# Altium footprint library Connector_PinHeader_1.27mm.PcbLib: 278 footprints (part 15 of 18)
Each footprint in its own frame and in the unit in brackets; x right, y up, seen from the top. Pads: shape width x height; smd on the part's side, far side on the other; paste and mask are expansions set on the pad; w line width, h text height; cw(c..) or ccw(c..) is an arc to the next point about the centre after c.
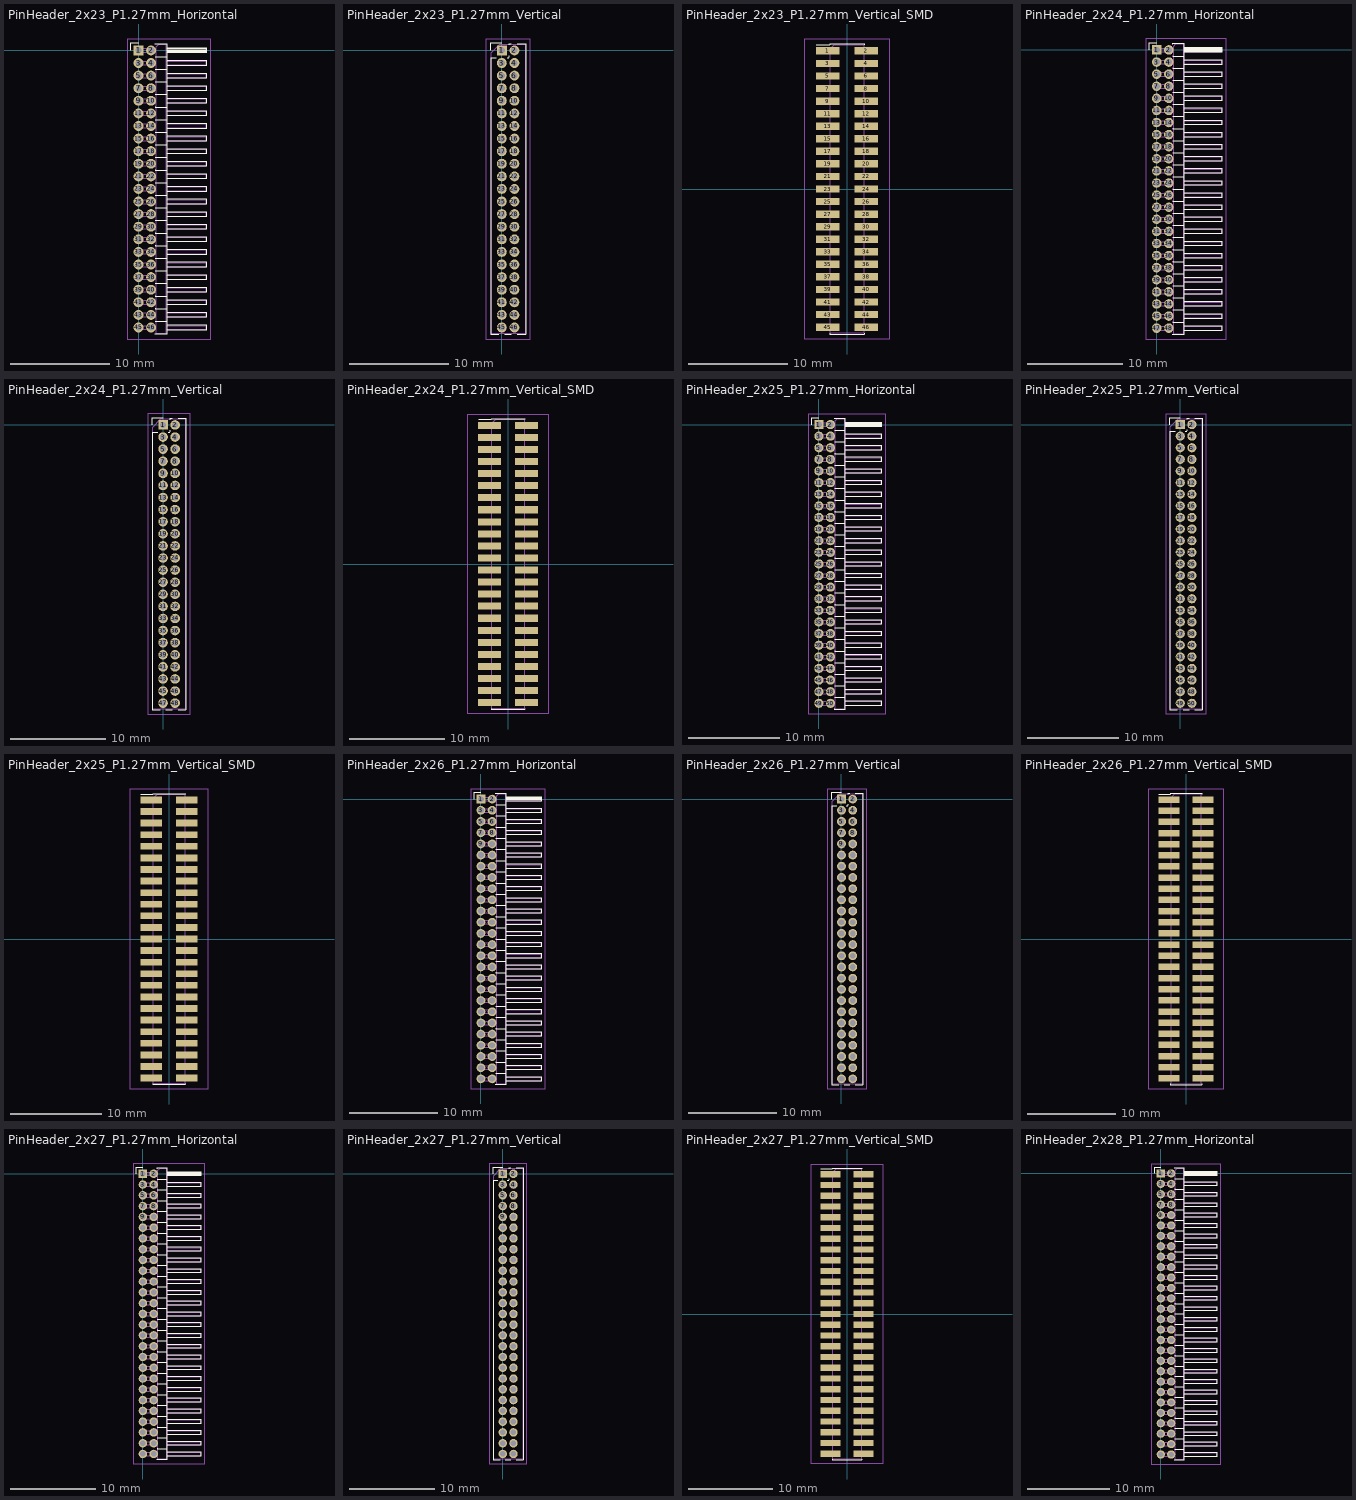
[diagram p14: the footprints below, top view; thin cyan lines are the x and y axes]

## PinHeader_2x23_P1.27mm_Horizontal [mm]
pads (46):
  rect 1x1 hole 0.65: 1(0,0)
  rrect100% 1x1 hole 0.65: 2(1.27,0) 3(0,-1.27) 4(1.27,-1.27) 5(0,-2.54) 6(1.27,-2.54) 7(0,-3.81) 8(1.27,-3.81) 9(0,-5.08) 10(1.27,-5.08) 11(0,-6.35) 12(1.27,-6.35) 13(0,-7.62) 14(1.27,-7.62) 15(0,-8.89) 16(1.27,-8.89) 17(0,-10.16) 18(1.27,-10.16) 19(0,-11.43) 20(1.27,-11.43) 21(0,-12.7) 22(1.27,-12.7) 23(0,-13.97) 24(1.27,-13.97) 25(0,-15.24) 26(1.27,-15.24) 27(0,-16.51) 28(1.27,-16.51) 29(0,-17.78) 30(1.27,-17.78) 31(0,-19.05) 32(1.27,-19.05) 33(0,-20.32) 34(1.27,-20.32) 35(0,-21.59) 36(1.27,-21.59) 37(0,-22.86) 38(1.27,-22.86) 39(0,-24.13) 40(1.27,-24.13) 41(0,-25.4) 42(1.27,-25.4) 43(0,-26.67) 44(1.27,-26.67) 45(0,-27.94) 46(1.27,-27.94)
F.SilkS:
  lines w0.12: -0.76,0 -0.76,0.76 0,0.76 ; 1.71,-28.56 1.71,-28.635 2.83,-28.635 2.83,0.695 1.71,0.695 1.71,0.62 ; 1.71,-27.32 1.71,-27.29 ; 1.71,-27.305 2.83,-27.305 ; 1.71,-26.05 1.71,-26.02 ; 1.71,-26.035 2.83,-26.035 ; 1.71,-24.78 1.71,-24.75 ; 1.71,-24.765 2.83,-24.765 ; 1.71,-23.51 1.71,-23.48 ; 1.71,-23.495 2.83,-23.495 ; 1.71,-22.24 1.71,-22.21 ; 1.71,-22.225 2.83,-22.225 ; 1.71,-20.97 1.71,-20.94 ; 1.71,-20.955 2.83,-20.955 ; 1.71,-19.7 1.71,-19.67 ; 1.71,-19.685 2.83,-19.685 ; 1.71,-18.43 1.71,-18.4 ; 1.71,-18.415 2.83,-18.415 ; 1.71,-17.16 1.71,-17.13 ; 1.71,-17.145 2.83,-17.145 ; 1.71,-15.89 1.71,-15.86 ; 1.71,-15.875 2.83,-15.875 ; 1.71,-14.62 1.71,-14.59 ; 1.71,-14.605 2.83,-14.605 ; 1.71,-13.35 1.71,-13.32 ; 1.71,-13.335 2.83,-13.335 ; 1.71,-12.08 1.71,-12.05 ; 1.71,-12.065 2.83,-12.065 ; 1.71,-10.81 1.71,-10.78 ; 1.71,-10.795 2.83,-10.795 ; 1.71,-9.54 1.71,-9.51 ; 1.71,-9.525 2.83,-9.525 ; 1.71,-8.27 1.71,-8.24 ; 1.71,-8.255 2.83,-8.255 ; 1.71,-7 1.71,-6.97 ; 1.71,-6.985 2.83,-6.985 ; 1.71,-5.73 1.71,-5.7 ; 1.71,-5.715 2.83,-5.715 ; 1.71,-4.46 1.71,-4.43 ; 1.71,-4.445 2.83,-4.445 ; 1.71,-3.19 1.71,-3.16 ; 1.71,-3.175 2.83,-3.175 ; 1.71,-1.92 1.71,-1.89 ; 1.71,-1.905 2.83,-1.905 ; 1.71,-0.65 1.71,-0.62 ; 1.71,-0.635 2.83,-0.635 ; 2.83,-28.2 6.83,-28.2 6.83,-27.68 2.83,-27.68 ; 2.83,-26.93 6.83,-26.93 6.83,-26.41 2.83,-26.41 ; 2.83,-25.66 6.83,-25.66 6.83,-25.14 2.83,-25.14 ; 2.83,-24.39 6.83,-24.39 6.83,-23.87 2.83,-23.87 ; 2.83,-23.12 6.83,-23.12 6.83,-22.6 2.83,-22.6 ; 2.83,-21.85 6.83,-21.85 6.83,-21.33 2.83,-21.33 ; 2.83,-20.58 6.83,-20.58 6.83,-20.06 2.83,-20.06 ; 2.83,-19.31 6.83,-19.31 6.83,-18.79 2.83,-18.79 ; 2.83,-18.04 6.83,-18.04 6.83,-17.52 2.83,-17.52 ; 2.83,-16.77 6.83,-16.77 6.83,-16.25 2.83,-16.25 ; 2.83,-15.5 6.83,-15.5 6.83,-14.98 2.83,-14.98 ; 2.83,-14.23 6.83,-14.23 6.83,-13.71 2.83,-13.71 ; 2.83,-12.96 6.83,-12.96 6.83,-12.44 2.83,-12.44 ; 2.83,-11.69 6.83,-11.69 6.83,-11.17 2.83,-11.17 ; 2.83,-10.42 6.83,-10.42 6.83,-9.9 2.83,-9.9 ; 2.83,-9.15 6.83,-9.15 6.83,-8.63 2.83,-8.63 ; 2.83,-7.88 6.83,-7.88 6.83,-7.36 2.83,-7.36 ; 2.83,-6.61 6.83,-6.61 6.83,-6.09 2.83,-6.09 ; 2.83,-5.34 6.83,-5.34 6.83,-4.82 2.83,-4.82 ; 2.83,-4.07 6.83,-4.07 6.83,-3.55 2.83,-3.55 ; 2.83,-2.8 6.83,-2.8 6.83,-2.28 2.83,-2.28 ; 2.83,-1.53 6.83,-1.53 6.83,-1.01 2.83,-1.01 ; 2.83,-0.26 6.83,-0.26 6.83,0.26 2.83,0.26 ; 2.83,-0.16 6.83,-0.16 ; 2.83,-0.04 6.83,-0.04 ; 2.83,0.08 6.83,0.08 ; 2.83,0.2 6.83,0.2
F.CrtYd:
  lines w0.05: -1.15,-29.1 7.3,-29.1 7.3,1.15 -1.15,1.15 -1.15,-29.1
F.Fab:
  lines w0.1: 1.77,-28.14 -0.2,-28.14 -0.2,-27.74 1.77,-27.74 ; 1.77,-26.87 -0.2,-26.87 -0.2,-26.47 1.77,-26.47 ; 1.77,-25.6 -0.2,-25.6 -0.2,-25.2 1.77,-25.2 ; 1.77,-24.33 -0.2,-24.33 -0.2,-23.93 1.77,-23.93 ; 1.77,-23.06 -0.2,-23.06 -0.2,-22.66 1.77,-22.66 ; 1.77,-21.79 -0.2,-21.79 -0.2,-21.39 1.77,-21.39 ; 1.77,-20.52 -0.2,-20.52 -0.2,-20.12 1.77,-20.12 ; 1.77,-19.25 -0.2,-19.25 -0.2,-18.85 1.77,-18.85 ; 1.77,-17.98 -0.2,-17.98 -0.2,-17.58 1.77,-17.58 ; 1.77,-16.71 -0.2,-16.71 -0.2,-16.31 1.77,-16.31 ; 1.77,-15.44 -0.2,-15.44 -0.2,-15.04 1.77,-15.04 ; 1.77,-14.17 -0.2,-14.17 -0.2,-13.77 1.77,-13.77 ; 1.77,-12.9 -0.2,-12.9 -0.2,-12.5 1.77,-12.5 ; 1.77,-11.63 -0.2,-11.63 -0.2,-11.23 1.77,-11.23 ; 1.77,-10.36 -0.2,-10.36 -0.2,-9.96 1.77,-9.96 ; 1.77,-9.09 -0.2,-9.09 -0.2,-8.69 1.77,-8.69 ; 1.77,-7.82 -0.2,-7.82 -0.2,-7.42 1.77,-7.42 ; 1.77,-6.55 -0.2,-6.55 -0.2,-6.15 1.77,-6.15 ; 1.77,-5.28 -0.2,-5.28 -0.2,-4.88 1.77,-4.88 ; 1.77,-4.01 -0.2,-4.01 -0.2,-3.61 1.77,-3.61 ; 1.77,-2.74 -0.2,-2.74 -0.2,-2.34 1.77,-2.34 ; 1.77,-1.47 -0.2,-1.47 -0.2,-1.07 1.77,-1.07 ; 1.77,-0.2 -0.2,-0.2 -0.2,0.2 1.77,0.2 ; 2.77,-28.14 6.77,-28.14 6.77,-27.74 2.77,-27.74 ; 2.77,-26.87 6.77,-26.87 6.77,-26.47 2.77,-26.47 ; 2.77,-25.6 6.77,-25.6 6.77,-25.2 2.77,-25.2 ; 2.77,-24.33 6.77,-24.33 6.77,-23.93 2.77,-23.93 ; 2.77,-23.06 6.77,-23.06 6.77,-22.66 2.77,-22.66 ; 2.77,-21.79 6.77,-21.79 6.77,-21.39 2.77,-21.39 ; 2.77,-20.52 6.77,-20.52 6.77,-20.12 2.77,-20.12 ; 2.77,-19.25 6.77,-19.25 6.77,-18.85 2.77,-18.85 ; 2.77,-17.98 6.77,-17.98 6.77,-17.58 2.77,-17.58 ; 2.77,-16.71 6.77,-16.71 6.77,-16.31 2.77,-16.31 ; 2.77,-15.44 6.77,-15.44 6.77,-15.04 2.77,-15.04 ; 2.77,-14.17 6.77,-14.17 6.77,-13.77 2.77,-13.77 ; 2.77,-12.9 6.77,-12.9 6.77,-12.5 2.77,-12.5 ; 2.77,-11.63 6.77,-11.63 6.77,-11.23 2.77,-11.23 ; 2.77,-10.36 6.77,-10.36 6.77,-9.96 2.77,-9.96 ; 2.77,-9.09 6.77,-9.09 6.77,-8.69 2.77,-8.69 ; 2.77,-7.82 6.77,-7.82 6.77,-7.42 2.77,-7.42 ; 2.77,-6.55 6.77,-6.55 6.77,-6.15 2.77,-6.15 ; 2.77,-5.28 6.77,-5.28 6.77,-4.88 2.77,-4.88 ; 2.77,-4.01 6.77,-4.01 6.77,-3.61 2.77,-3.61 ; 2.77,-2.74 6.77,-2.74 6.77,-2.34 2.77,-2.34 ; 2.77,-1.47 6.77,-1.47 6.77,-1.07 2.77,-1.07 ; 2.77,-0.2 6.77,-0.2 6.77,0.2 2.77,0.2 ; 1.77,-28.575 2.77,-28.575 2.77,0.635 2.02,0.635 1.77,0.385 1.77,-28.575
  text "'.Designator'" at 2.774,-16.398 h0.6

## PinHeader_2x23_P1.27mm_Vertical [mm]
pads (46):
  rect 1x1 hole 0.65: 1(0,0)
  rrect100% 1x1 hole 0.65: 2(1.27,0) 3(0,-1.27) 4(1.27,-1.27) 5(0,-2.54) 6(1.27,-2.54) 7(0,-3.81) 8(1.27,-3.81) 9(0,-5.08) 10(1.27,-5.08) 11(0,-6.35) 12(1.27,-6.35) 13(0,-7.62) 14(1.27,-7.62) 15(0,-8.89) 16(1.27,-8.89) 17(0,-10.16) 18(1.27,-10.16) 19(0,-11.43) 20(1.27,-11.43) 21(0,-12.7) 22(1.27,-12.7) 23(0,-13.97) 24(1.27,-13.97) 25(0,-15.24) 26(1.27,-15.24) 27(0,-16.51) 28(1.27,-16.51) 29(0,-17.78) 30(1.27,-17.78) 31(0,-19.05) 32(1.27,-19.05) 33(0,-20.32) 34(1.27,-20.32) 35(0,-21.59) 36(1.27,-21.59) 37(0,-22.86) 38(1.27,-22.86) 39(0,-24.13) 40(1.27,-24.13) 41(0,-25.4) 42(1.27,-25.4) 43(0,-26.67) 44(1.27,-26.67) 45(0,-27.94) 46(1.27,-27.94)
F.SilkS:
  lines w0.12: -1.13,0 -1.13,0.76 0,0.76 ; -0.563,-0.76 -1.13,-0.76 -1.13,-28.635 -0.308,-28.635 ; 0.308,-28.635 0.962,-28.635 ; 0.563,-0.76 0.707,-0.76 ; 0.76,-0.707 0.76,-0.563 ; 0.76,0.563 0.76,0.695 0.962,0.695 ; 1.578,-28.635 2.4,-28.635 2.4,0.695 1.578,0.695
F.CrtYd:
  lines w0.05: -1.6,-29.1 2.85,-29.1 2.85,1.15 -1.6,1.15 -1.6,-29.1
F.Fab:
  lines w0.1: -1.07,-28.575 -1.07,-0.218 -0.218,0.635 2.34,0.635 2.34,-28.575 -1.07,-28.575
  text "'.Designator'" at 1.475,-18.017 h1

## PinHeader_2x23_P1.27mm_Vertical_SMD [mm]
pads (46):
  rect 2.4x0.74 smd: 1(-1.95,13.97) 2(1.95,13.97) 3(-1.95,12.7) 4(1.95,12.7) 5(-1.95,11.43) 6(1.95,11.43) 7(-1.95,10.16) 8(1.95,10.16) 9(-1.95,8.89) 10(1.95,8.89) 11(-1.95,7.62) 12(1.95,7.62) 13(-1.95,6.35) 14(1.95,6.35) 15(-1.95,5.08) 16(1.95,5.08) 17(-1.95,3.81) 18(1.95,3.81) 19(-1.95,2.54) 20(1.95,2.54) 21(-1.95,1.27) 22(1.95,1.27) 23(-1.95,0) 24(1.95,0) 25(-1.95,-1.27) 26(1.95,-1.27) 27(-1.95,-2.54) 28(1.95,-2.54) 29(-1.95,-3.81) 30(1.95,-3.81) 31(-1.95,-5.08) 32(1.95,-5.08) 33(-1.95,-6.35) 34(1.95,-6.35) 35(-1.95,-7.62) 36(1.95,-7.62) 37(-1.95,-8.89) 38(1.95,-8.89) 39(-1.95,-10.16) 40(1.95,-10.16) 41(-1.95,-11.43) 42(1.95,-11.43) 43(-1.95,-12.7) 44(1.95,-12.7) 45(-1.95,-13.97) 46(1.95,-13.97)
F.SilkS:
  lines w0.12: -3.09,14.6 -1.765,14.6 -1.765,14.665 1.765,14.665 1.765,14.6 ; -1.765,-14.6 -1.765,-14.665 1.765,-14.665 1.765,-14.6
F.CrtYd:
  lines w0.05: -4.3,-15.15 4.3,-15.15 4.3,15.15 -4.3,15.15 -4.3,-15.15
F.Fab:
  lines w0.1: -1.705,-14.17 -2.75,-14.17 -2.75,-13.77 -1.705,-13.77 ; -1.705,-12.9 -2.75,-12.9 -2.75,-12.5 -1.705,-12.5 ; -1.705,-11.63 -2.75,-11.63 -2.75,-11.23 -1.705,-11.23 ; -1.705,-10.36 -2.75,-10.36 -2.75,-9.96 -1.705,-9.96 ; -1.705,-9.09 -2.75,-9.09 -2.75,-8.69 -1.705,-8.69 ; -1.705,-7.82 -2.75,-7.82 -2.75,-7.42 -1.705,-7.42 ; -1.705,-6.55 -2.75,-6.55 -2.75,-6.15 -1.705,-6.15 ; -1.705,-5.28 -2.75,-5.28 -2.75,-4.88 -1.705,-4.88 ; -1.705,-4.01 -2.75,-4.01 -2.75,-3.61 -1.705,-3.61 ; -1.705,-2.74 -2.75,-2.74 -2.75,-2.34 -1.705,-2.34 ; -1.705,-1.47 -2.75,-1.47 -2.75,-1.07 -1.705,-1.07 ; -1.705,-0.2 -2.75,-0.2 -2.75,0.2 -1.705,0.2 ; -1.705,1.07 -2.75,1.07 -2.75,1.47 -1.705,1.47 ; -1.705,2.34 -2.75,2.34 -2.75,2.74 -1.705,2.74 ; -1.705,3.61 -2.75,3.61 -2.75,4.01 -1.705,4.01 ; -1.705,4.88 -2.75,4.88 -2.75,5.28 -1.705,5.28 ; -1.705,6.15 -2.75,6.15 -2.75,6.55 -1.705,6.55 ; -1.705,7.42 -2.75,7.42 -2.75,7.82 -1.705,7.82 ; -1.705,8.69 -2.75,8.69 -2.75,9.09 -1.705,9.09 ; -1.705,9.96 -2.75,9.96 -2.75,10.36 -1.705,10.36 ; -1.705,11.23 -2.75,11.23 -2.75,11.63 -1.705,11.63 ; -1.705,12.5 -2.75,12.5 -2.75,12.9 -1.705,12.9 ; -1.705,13.77 -2.75,13.77 -2.75,14.17 -1.705,14.17 ; 1.705,-14.17 2.75,-14.17 2.75,-13.77 1.705,-13.77 ; 1.705,-12.9 2.75,-12.9 2.75,-12.5 1.705,-12.5 ; 1.705,-11.63 2.75,-11.63 2.75,-11.23 1.705,-11.23 ; 1.705,-10.36 2.75,-10.36 2.75,-9.96 1.705,-9.96 ; 1.705,-9.09 2.75,-9.09 2.75,-8.69 1.705,-8.69 ; 1.705,-7.82 2.75,-7.82 2.75,-7.42 1.705,-7.42 ; 1.705,-6.55 2.75,-6.55 2.75,-6.15 1.705,-6.15 ; 1.705,-5.28 2.75,-5.28 2.75,-4.88 1.705,-4.88 ; 1.705,-4.01 2.75,-4.01 2.75,-3.61 1.705,-3.61 ; 1.705,-2.74 2.75,-2.74 2.75,-2.34 1.705,-2.34 ; 1.705,-1.47 2.75,-1.47 2.75,-1.07 1.705,-1.07 ; 1.705,-0.2 2.75,-0.2 2.75,0.2 1.705,0.2 ; 1.705,1.07 2.75,1.07 2.75,1.47 1.705,1.47 ; 1.705,2.34 2.75,2.34 2.75,2.74 1.705,2.74 ; 1.705,3.61 2.75,3.61 2.75,4.01 1.705,4.01 ; 1.705,4.88 2.75,4.88 2.75,5.28 1.705,5.28 ; 1.705,6.15 2.75,6.15 2.75,6.55 1.705,6.55 ; 1.705,7.42 2.75,7.42 2.75,7.82 1.705,7.82 ; 1.705,8.69 2.75,8.69 2.75,9.09 1.705,9.09 ; 1.705,9.96 2.75,9.96 2.75,10.36 1.705,10.36 ; 1.705,11.23 2.75,11.23 2.75,11.63 1.705,11.63 ; 1.705,12.5 2.75,12.5 2.75,12.9 1.705,12.9 ; 1.705,13.77 2.75,13.77 2.75,14.17 1.705,14.17 ; -1.705,14.17 -1.705,-14.605 1.705,-14.605 1.705,14.605 -1.27,14.605 -1.705,14.17
  text "'.Designator'" at 0.84,-4.047 h1

## PinHeader_2x24_P1.27mm_Horizontal [mm]
pads (48):
  rect 1x1 hole 0.65: 1(0,0)
  rrect100% 1x1 hole 0.65: 2(1.27,0) 3(0,-1.27) 4(1.27,-1.27) 5(0,-2.54) 6(1.27,-2.54) 7(0,-3.81) 8(1.27,-3.81) 9(0,-5.08) 10(1.27,-5.08) 11(0,-6.35) 12(1.27,-6.35) 13(0,-7.62) 14(1.27,-7.62) 15(0,-8.89) 16(1.27,-8.89) 17(0,-10.16) 18(1.27,-10.16) 19(0,-11.43) 20(1.27,-11.43) 21(0,-12.7) 22(1.27,-12.7) 23(0,-13.97) 24(1.27,-13.97) 25(0,-15.24) 26(1.27,-15.24) 27(0,-16.51) 28(1.27,-16.51) 29(0,-17.78) 30(1.27,-17.78) 31(0,-19.05) 32(1.27,-19.05) 33(0,-20.32) 34(1.27,-20.32) 35(0,-21.59) 36(1.27,-21.59) 37(0,-22.86) 38(1.27,-22.86) 39(0,-24.13) 40(1.27,-24.13) 41(0,-25.4) 42(1.27,-25.4) 43(0,-26.67) 44(1.27,-26.67) 45(0,-27.94) 46(1.27,-27.94) 47(0,-29.21) 48(1.27,-29.21)
F.SilkS:
  lines w0.12: -0.76,0 -0.76,0.76 0,0.76 ; 1.71,-29.83 1.71,-29.905 2.83,-29.905 2.83,0.695 1.71,0.695 1.71,0.62 ; 1.71,-28.59 1.71,-28.56 ; 1.71,-28.575 2.83,-28.575 ; 1.71,-27.32 1.71,-27.29 ; 1.71,-27.305 2.83,-27.305 ; 1.71,-26.05 1.71,-26.02 ; 1.71,-26.035 2.83,-26.035 ; 1.71,-24.78 1.71,-24.75 ; 1.71,-24.765 2.83,-24.765 ; 1.71,-23.51 1.71,-23.48 ; 1.71,-23.495 2.83,-23.495 ; 1.71,-22.24 1.71,-22.21 ; 1.71,-22.225 2.83,-22.225 ; 1.71,-20.97 1.71,-20.94 ; 1.71,-20.955 2.83,-20.955 ; 1.71,-19.7 1.71,-19.67 ; 1.71,-19.685 2.83,-19.685 ; 1.71,-18.43 1.71,-18.4 ; 1.71,-18.415 2.83,-18.415 ; 1.71,-17.16 1.71,-17.13 ; 1.71,-17.145 2.83,-17.145 ; 1.71,-15.89 1.71,-15.86 ; 1.71,-15.875 2.83,-15.875 ; 1.71,-14.62 1.71,-14.59 ; 1.71,-14.605 2.83,-14.605 ; 1.71,-13.35 1.71,-13.32 ; 1.71,-13.335 2.83,-13.335 ; 1.71,-12.08 1.71,-12.05 ; 1.71,-12.065 2.83,-12.065 ; 1.71,-10.81 1.71,-10.78 ; 1.71,-10.795 2.83,-10.795 ; 1.71,-9.54 1.71,-9.51 ; 1.71,-9.525 2.83,-9.525 ; 1.71,-8.27 1.71,-8.24 ; 1.71,-8.255 2.83,-8.255 ; 1.71,-7 1.71,-6.97 ; 1.71,-6.985 2.83,-6.985 ; 1.71,-5.73 1.71,-5.7 ; 1.71,-5.715 2.83,-5.715 ; 1.71,-4.46 1.71,-4.43 ; 1.71,-4.445 2.83,-4.445 ; 1.71,-3.19 1.71,-3.16 ; 1.71,-3.175 2.83,-3.175 ; 1.71,-1.92 1.71,-1.89 ; 1.71,-1.905 2.83,-1.905 ; 1.71,-0.65 1.71,-0.62 ; 1.71,-0.635 2.83,-0.635 ; 2.83,-29.47 6.83,-29.47 6.83,-28.95 2.83,-28.95 ; 2.83,-28.2 6.83,-28.2 6.83,-27.68 2.83,-27.68 ; 2.83,-26.93 6.83,-26.93 6.83,-26.41 2.83,-26.41 ; 2.83,-25.66 6.83,-25.66 6.83,-25.14 2.83,-25.14 ; 2.83,-24.39 6.83,-24.39 6.83,-23.87 2.83,-23.87 ; 2.83,-23.12 6.83,-23.12 6.83,-22.6 2.83,-22.6 ; 2.83,-21.85 6.83,-21.85 6.83,-21.33 2.83,-21.33 ; 2.83,-20.58 6.83,-20.58 6.83,-20.06 2.83,-20.06 ; 2.83,-19.31 6.83,-19.31 6.83,-18.79 2.83,-18.79 ; 2.83,-18.04 6.83,-18.04 6.83,-17.52 2.83,-17.52 ; 2.83,-16.77 6.83,-16.77 6.83,-16.25 2.83,-16.25 ; 2.83,-15.5 6.83,-15.5 6.83,-14.98 2.83,-14.98 ; 2.83,-14.23 6.83,-14.23 6.83,-13.71 2.83,-13.71 ; 2.83,-12.96 6.83,-12.96 6.83,-12.44 2.83,-12.44 ; 2.83,-11.69 6.83,-11.69 6.83,-11.17 2.83,-11.17 ; 2.83,-10.42 6.83,-10.42 6.83,-9.9 2.83,-9.9 ; 2.83,-9.15 6.83,-9.15 6.83,-8.63 2.83,-8.63 ; 2.83,-7.88 6.83,-7.88 6.83,-7.36 2.83,-7.36 ; 2.83,-6.61 6.83,-6.61 6.83,-6.09 2.83,-6.09 ; 2.83,-5.34 6.83,-5.34 6.83,-4.82 2.83,-4.82 ; 2.83,-4.07 6.83,-4.07 6.83,-3.55 2.83,-3.55 ; 2.83,-2.8 6.83,-2.8 6.83,-2.28 2.83,-2.28 ; 2.83,-1.53 6.83,-1.53 6.83,-1.01 2.83,-1.01 ; 2.83,-0.26 6.83,-0.26 6.83,0.26 2.83,0.26 ; 2.83,-0.16 6.83,-0.16 ; 2.83,-0.04 6.83,-0.04 ; 2.83,0.08 6.83,0.08 ; 2.83,0.2 6.83,0.2
F.CrtYd:
  lines w0.05: -1.15,-30.35 -1.15,1.15 7.3,1.15 7.3,-30.35 -1.15,-30.35
F.Fab:
  lines w0.1: 1.77,-29.41 -0.2,-29.41 -0.2,-29.01 1.77,-29.01 ; 1.77,-28.14 -0.2,-28.14 -0.2,-27.74 1.77,-27.74 ; 1.77,-26.87 -0.2,-26.87 -0.2,-26.47 1.77,-26.47 ; 1.77,-25.6 -0.2,-25.6 -0.2,-25.2 1.77,-25.2 ; 1.77,-24.33 -0.2,-24.33 -0.2,-23.93 1.77,-23.93 ; 1.77,-23.06 -0.2,-23.06 -0.2,-22.66 1.77,-22.66 ; 1.77,-21.79 -0.2,-21.79 -0.2,-21.39 1.77,-21.39 ; 1.77,-20.52 -0.2,-20.52 -0.2,-20.12 1.77,-20.12 ; 1.77,-19.25 -0.2,-19.25 -0.2,-18.85 1.77,-18.85 ; 1.77,-17.98 -0.2,-17.98 -0.2,-17.58 1.77,-17.58 ; 1.77,-16.71 -0.2,-16.71 -0.2,-16.31 1.77,-16.31 ; 1.77,-15.44 -0.2,-15.44 -0.2,-15.04 1.77,-15.04 ; 1.77,-14.17 -0.2,-14.17 -0.2,-13.77 1.77,-13.77 ; 1.77,-12.9 -0.2,-12.9 -0.2,-12.5 1.77,-12.5 ; 1.77,-11.63 -0.2,-11.63 -0.2,-11.23 1.77,-11.23 ; 1.77,-10.36 -0.2,-10.36 -0.2,-9.96 1.77,-9.96 ; 1.77,-9.09 -0.2,-9.09 -0.2,-8.69 1.77,-8.69 ; 1.77,-7.82 -0.2,-7.82 -0.2,-7.42 1.77,-7.42 ; 1.77,-6.55 -0.2,-6.55 -0.2,-6.15 1.77,-6.15 ; 1.77,-5.28 -0.2,-5.28 -0.2,-4.88 1.77,-4.88 ; 1.77,-4.01 -0.2,-4.01 -0.2,-3.61 1.77,-3.61 ; 1.77,-2.74 -0.2,-2.74 -0.2,-2.34 1.77,-2.34 ; 1.77,-1.47 -0.2,-1.47 -0.2,-1.07 1.77,-1.07 ; 1.77,-0.2 -0.2,-0.2 -0.2,0.2 1.77,0.2 ; 2.77,-29.41 6.77,-29.41 6.77,-29.01 2.77,-29.01 ; 2.77,-28.14 6.77,-28.14 6.77,-27.74 2.77,-27.74 ; 2.77,-26.87 6.77,-26.87 6.77,-26.47 2.77,-26.47 ; 2.77,-25.6 6.77,-25.6 6.77,-25.2 2.77,-25.2 ; 2.77,-24.33 6.77,-24.33 6.77,-23.93 2.77,-23.93 ; 2.77,-23.06 6.77,-23.06 6.77,-22.66 2.77,-22.66 ; 2.77,-21.79 6.77,-21.79 6.77,-21.39 2.77,-21.39 ; 2.77,-20.52 6.77,-20.52 6.77,-20.12 2.77,-20.12 ; 2.77,-19.25 6.77,-19.25 6.77,-18.85 2.77,-18.85 ; 2.77,-17.98 6.77,-17.98 6.77,-17.58 2.77,-17.58 ; 2.77,-16.71 6.77,-16.71 6.77,-16.31 2.77,-16.31 ; 2.77,-15.44 6.77,-15.44 6.77,-15.04 2.77,-15.04 ; 2.77,-14.17 6.77,-14.17 6.77,-13.77 2.77,-13.77 ; 2.77,-12.9 6.77,-12.9 6.77,-12.5 2.77,-12.5 ; 2.77,-11.63 6.77,-11.63 6.77,-11.23 2.77,-11.23 ; 2.77,-10.36 6.77,-10.36 6.77,-9.96 2.77,-9.96 ; 2.77,-9.09 6.77,-9.09 6.77,-8.69 2.77,-8.69 ; 2.77,-7.82 6.77,-7.82 6.77,-7.42 2.77,-7.42 ; 2.77,-6.55 6.77,-6.55 6.77,-6.15 2.77,-6.15 ; 2.77,-5.28 6.77,-5.28 6.77,-4.88 2.77,-4.88 ; 2.77,-4.01 6.77,-4.01 6.77,-3.61 2.77,-3.61 ; 2.77,-2.74 6.77,-2.74 6.77,-2.34 2.77,-2.34 ; 2.77,-1.47 6.77,-1.47 6.77,-1.07 2.77,-1.07 ; 2.77,-0.2 6.77,-0.2 6.77,0.2 2.77,0.2 ; 1.77,-29.845 1.77,0.385 2.02,0.635 2.77,0.635 2.77,-29.845 1.77,-29.845
  text "'.Designator'" at 2.774,-17.033 h0.6

## PinHeader_2x24_P1.27mm_Vertical [mm]
pads (48):
  rect 1x1 hole 0.65: 1(0,0)
  rrect100% 1x1 hole 0.65: 2(1.27,0) 3(0,-1.27) 4(1.27,-1.27) 5(0,-2.54) 6(1.27,-2.54) 7(0,-3.81) 8(1.27,-3.81) 9(0,-5.08) 10(1.27,-5.08) 11(0,-6.35) 12(1.27,-6.35) 13(0,-7.62) 14(1.27,-7.62) 15(0,-8.89) 16(1.27,-8.89) 17(0,-10.16) 18(1.27,-10.16) 19(0,-11.43) 20(1.27,-11.43) 21(0,-12.7) 22(1.27,-12.7) 23(0,-13.97) 24(1.27,-13.97) 25(0,-15.24) 26(1.27,-15.24) 27(0,-16.51) 28(1.27,-16.51) 29(0,-17.78) 30(1.27,-17.78) 31(0,-19.05) 32(1.27,-19.05) 33(0,-20.32) 34(1.27,-20.32) 35(0,-21.59) 36(1.27,-21.59) 37(0,-22.86) 38(1.27,-22.86) 39(0,-24.13) 40(1.27,-24.13) 41(0,-25.4) 42(1.27,-25.4) 43(0,-26.67) 44(1.27,-26.67) 45(0,-27.94) 46(1.27,-27.94) 47(0,-29.21) 48(1.27,-29.21)
F.SilkS:
  lines w0.12: -1.13,0 -1.13,0.76 0,0.76 ; -0.563,-0.76 -1.13,-0.76 -1.13,-29.905 -0.308,-29.905 ; 0.308,-29.905 0.962,-29.905 ; 0.563,-0.76 0.707,-0.76 ; 0.76,-0.707 0.76,-0.563 ; 0.76,0.563 0.76,0.695 0.962,0.695 ; 1.578,-29.905 2.4,-29.905 2.4,0.695 1.578,0.695
F.CrtYd:
  lines w0.05: -1.6,-30.35 2.85,-30.35 2.85,1.15 -1.6,1.15 -1.6,-30.35
F.Fab:
  lines w0.1: -1.07,-29.845 -1.07,-0.218 -0.218,0.635 2.34,0.635 2.34,-29.845 -1.07,-29.845
  text "'.Designator'" at 1.475,-18.652 h1

## PinHeader_2x24_P1.27mm_Vertical_SMD [mm]
pads (48):
  rect 2.4x0.74 smd: 1(-1.95,14.605) 2(1.95,14.605) 3(-1.95,13.335) 4(1.95,13.335) 5(-1.95,12.065) 6(1.95,12.065) 7(-1.95,10.795) 8(1.95,10.795) 9(-1.95,9.525) 10(1.95,9.525) 11(-1.95,8.255) 12(1.95,8.255) 13(-1.95,6.985) 14(1.95,6.985) 15(-1.95,5.715) 16(1.95,5.715) 17(-1.95,4.445) 18(1.95,4.445) 19(-1.95,3.175) 20(1.95,3.175) 21(-1.95,1.905) 22(1.95,1.905) 23(-1.95,0.635) 24(1.95,0.635) 25(-1.95,-0.635) 26(1.95,-0.635) 27(-1.95,-1.905) 28(1.95,-1.905) 29(-1.95,-3.175) 30(1.95,-3.175) 31(-1.95,-4.445) 32(1.95,-4.445) 33(-1.95,-5.715) 34(1.95,-5.715) 35(-1.95,-6.985) 36(1.95,-6.985) 37(-1.95,-8.255) 38(1.95,-8.255) 39(-1.95,-9.525) 40(1.95,-9.525) 41(-1.95,-10.795) 42(1.95,-10.795) 43(-1.95,-12.065) 44(1.95,-12.065) 45(-1.95,-13.335) 46(1.95,-13.335) 47(-1.95,-14.605) 48(1.95,-14.605)
F.SilkS:
  lines w0.12: -3.09,15.235 -1.765,15.235 -1.765,15.3 1.765,15.3 1.765,15.235 ; -1.765,-15.235 -1.765,-15.3 1.765,-15.3 1.765,-15.235
F.CrtYd:
  lines w0.05: -4.3,-15.75 4.3,-15.75 4.3,15.75 -4.3,15.75 -4.3,-15.75
F.Fab:
  lines w0.1: -1.705,-14.805 -2.75,-14.805 -2.75,-14.405 -1.705,-14.405 ; -1.705,-13.535 -2.75,-13.535 -2.75,-13.135 -1.705,-13.135 ; -1.705,-12.265 -2.75,-12.265 -2.75,-11.865 -1.705,-11.865 ; -1.705,-10.995 -2.75,-10.995 -2.75,-10.595 -1.705,-10.595 ; -1.705,-9.725 -2.75,-9.725 -2.75,-9.325 -1.705,-9.325 ; -1.705,-8.455 -2.75,-8.455 -2.75,-8.055 -1.705,-8.055 ; -1.705,-7.185 -2.75,-7.185 -2.75,-6.785 -1.705,-6.785 ; -1.705,-5.915 -2.75,-5.915 -2.75,-5.515 -1.705,-5.515 ; -1.705,-4.645 -2.75,-4.645 -2.75,-4.245 -1.705,-4.245 ; -1.705,-3.375 -2.75,-3.375 -2.75,-2.975 -1.705,-2.975 ; -1.705,-2.105 -2.75,-2.105 -2.75,-1.705 -1.705,-1.705 ; -1.705,-0.835 -2.75,-0.835 -2.75,-0.435 -1.705,-0.435 ; -1.705,0.435 -2.75,0.435 -2.75,0.835 -1.705,0.835 ; -1.705,1.705 -2.75,1.705 -2.75,2.105 -1.705,2.105 ; -1.705,2.975 -2.75,2.975 -2.75,3.375 -1.705,3.375 ; -1.705,4.245 -2.75,4.245 -2.75,4.645 -1.705,4.645 ; -1.705,5.515 -2.75,5.515 -2.75,5.915 -1.705,5.915 ; -1.705,6.785 -2.75,6.785 -2.75,7.185 -1.705,7.185 ; -1.705,8.055 -2.75,8.055 -2.75,8.455 -1.705,8.455 ; -1.705,9.325 -2.75,9.325 -2.75,9.725 -1.705,9.725 ; -1.705,10.595 -2.75,10.595 -2.75,10.995 -1.705,10.995 ; -1.705,11.865 -2.75,11.865 -2.75,12.265 -1.705,12.265 ; -1.705,13.135 -2.75,13.135 -2.75,13.535 -1.705,13.535 ; -1.705,14.405 -2.75,14.405 -2.75,14.805 -1.705,14.805 ; 1.705,-14.805 2.75,-14.805 2.75,-14.405 1.705,-14.405 ; 1.705,-13.535 2.75,-13.535 2.75,-13.135 1.705,-13.135 ; 1.705,-12.265 2.75,-12.265 2.75,-11.865 1.705,-11.865 ; 1.705,-10.995 2.75,-10.995 2.75,-10.595 1.705,-10.595 ; 1.705,-9.725 2.75,-9.725 2.75,-9.325 1.705,-9.325 ; 1.705,-8.455 2.75,-8.455 2.75,-8.055 1.705,-8.055 ; 1.705,-7.185 2.75,-7.185 2.75,-6.785 1.705,-6.785 ; 1.705,-5.915 2.75,-5.915 2.75,-5.515 1.705,-5.515 ; 1.705,-4.645 2.75,-4.645 2.75,-4.245 1.705,-4.245 ; 1.705,-3.375 2.75,-3.375 2.75,-2.975 1.705,-2.975 ; 1.705,-2.105 2.75,-2.105 2.75,-1.705 1.705,-1.705 ; 1.705,-0.835 2.75,-0.835 2.75,-0.435 1.705,-0.435 ; 1.705,0.435 2.75,0.435 2.75,0.835 1.705,0.835 ; 1.705,1.705 2.75,1.705 2.75,2.105 1.705,2.105 ; 1.705,2.975 2.75,2.975 2.75,3.375 1.705,3.375 ; 1.705,4.245 2.75,4.245 2.75,4.645 1.705,4.645 ; 1.705,5.515 2.75,5.515 2.75,5.915 1.705,5.915 ; 1.705,6.785 2.75,6.785 2.75,7.185 1.705,7.185 ; 1.705,8.055 2.75,8.055 2.75,8.455 1.705,8.455 ; 1.705,9.325 2.75,9.325 2.75,9.725 1.705,9.725 ; 1.705,10.595 2.75,10.595 2.75,10.995 1.705,10.995 ; 1.705,11.865 2.75,11.865 2.75,12.265 1.705,12.265 ; 1.705,13.135 2.75,13.135 2.75,13.535 1.705,13.535 ; 1.705,14.405 2.75,14.405 2.75,14.805 1.705,14.805 ; -1.705,14.805 -1.27,15.24 1.705,15.24 1.705,-15.24 -1.705,-15.24 -1.705,14.805